# Altium footprint library разъёмы.PcbLib: 129 footprints (part 1 of 9)
Each footprint in its own frame and in the unit in brackets; x right, y up, seen from the top. Pads: shape width x height; smd on the part's side, far side on the other; paste and mask are expansions set on the pad; w line width, h text height; cw(c..) or ccw(c..) is an arc to the next point about the centre after c.
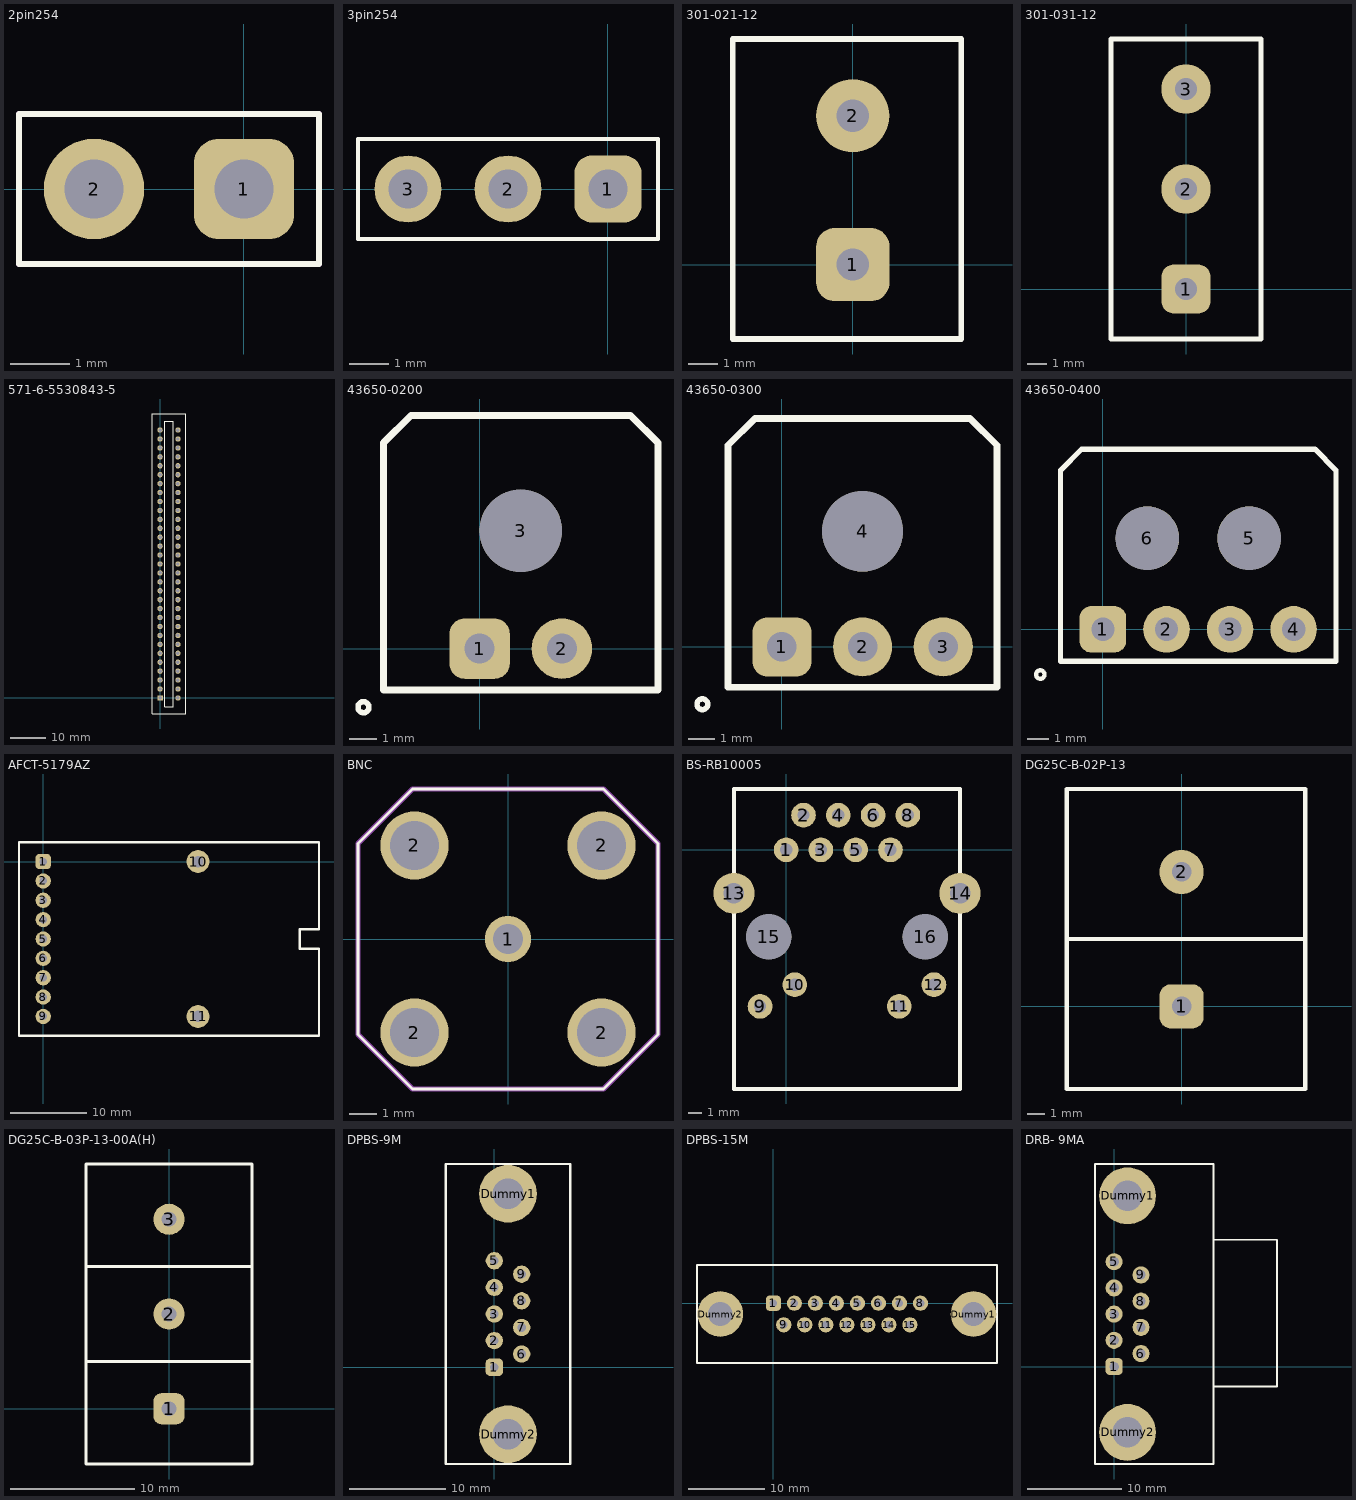
[diagram p0: the footprints below, top view; thin cyan lines are the x and y axes]

## 2pin254 [mm]
pads (2):
  rrect50% 1.7x1.7 hole 1: 1(0,0)
  round 1.7 hole 1: 2(-2.541,0)
Top Overlay:
  lines w0.1: -3.811,-1.27 1.27,-1.27 1.27,1.27 -3.811,1.27 -3.811,-1.27
Mechanical 13:
  lines w0.1: -3.811,-1.27 -3.811,1.27 1.27,1.27 1.27,-1.27 -3.811,-1.27
  text ".Designator" at -3.135,-0.755 h1.5
3D body "Header1x2.STEP": height 8.49, standoff -2.49, extent -3.805,-1.27 1.275,1.27

## 3pin254 [mm]
pads (3):
  rrect50% 1.7x1.7 hole 1: 1(0,0)
  round 1.7 hole 1: 2(-2.541,0) 3(-5.081,0)
Top Overlay:
  lines w0.1: -3.811,-1.27 1.27,-1.27 1.27,1.27 -3.811,1.27 ; -1.27,-1.27 -6.351,-1.27 -6.351,1.27 -1.27,1.27
Mechanical 13:
  lines w0.1: -6.351,-1.27 1.27,-1.27 1.27,1.27 -6.351,1.27 -6.351,-1.27
  text ".Designator" at -0.875,0.75 h1.5
3D body "Header1x2.STEP": height 8.49, standoff -2.49, extent -3.805,-1.27 1.275,1.27
3D body "Header1x2.STEP": height 8.49, standoff -2.49, extent -6.345,-1.27 -1.265,1.27

## 301-021-12 [mm] "XY301VA-5.0-2P-12, Клеммник винтовой, 2-контактный, 5мм, прямой"
height 10
pads (2):
  rrect50% 2.5x2.5 hole 1.1 mask+0.025: 1(0,0)
  round 2.5 hole 1.1 mask+0.025: 2(0,5.08)
Top Overlay:
  lines w0.2: -4.1,-2.54 -4.1,7.7 3.7,7.7 3.7,-2.54 -4.1,-2.54
3D body "User Library-xy301a_5.STEP": height 2.65, standoff -11.75, extent -4,-3.15 3.6,7.55

## 301-031-12 [mm] "XY301VA-5.0-3P-12, Клеммник винтовой, 3-контактный, 5мм, прямой"
height 10
pads (3):
  rrect50% 2.5x2.5 hole 1.1: 1(0,0)
  round 2.5 hole 1.1: 2(0,5.08) 3(0,10.16)
Top Overlay:
  lines w0.254: -3.81,-2.54 -3.81,12.7 3.81,12.7 3.81,-2.54 -3.81,-2.54
3D body "User Library-Terminal-Screw-3A-3way.SLDPRT": height 10, standoff -3, extent -3.81,-2.466 3.79,13.134

## 571-6-5530843-5 [mil]
pads (62):
  rect 60x60 hole 38: A1(0,0)
  round 60 hole 38: A2(0,100) A3(0,200) A4(0,300) A5(0,400) A6(0,500) A7(0,600) A8(0,700) A9(0,800) A10(0,900) A11(0,1000) A12(0,1100) A13(0,1200) A14(0,1300) A15(0,1400) A16(0,1500) A17(0,1600) A18(0,1700) A19(0,1800) A20(0,1900) A21(0,2000) A22(0,2100) A23(0,2200) A24(0,2300) A25(0,2400) A26(0,2500) A27(0,2600) A28(0,2700) A29(0,2800) A30(0,2900) A31(0,3000) B1(200,0) B2(200,100) B3(200,200) B4(200,300) B5(200,400) B6(200,500) B7(200,600) B8(200,700) B9(200,800) B10(200,900) B11(200,1000) B12(200,1100) B13(200,1200) B14(200,1300) B15(200,1400) B16(200,1500) B17(200,1600) B18(200,1700) B19(200,1800) B20(200,1900) B21(200,2000) B22(200,2100) B23(200,2200) B24(200,2300) B25(200,2400) B26(200,2500) B27(200,2600) B28(200,2700) B29(200,2800) B30(200,2900) B31(200,3000)
Top Overlay:
  lines w10: -85,-180 285,-180 285,3180 -85,3180 -85,-180 ; 50,-100 150,-100 150,3100 50,3100 50,-100

## 43650-0200 [mm]
pads (3):
  rrect50% 2.2x2.2 hole 1.1: 1(0,0)
  round 2.2 hole 1.1: 2(3,0)
  round 3 hole 3: 3(1.5,4.3)
Top Overlay:
  circle w0.2: c-4.229,-2.134 r0.2
  lines w0.254: -3.5,-1.5 6.5,-1.5 6.5,7.5 5.5,8.5 -2.5,8.5 -3.5,7.5 -3.5,-1.5

## 43650-0300 [mm]
pads (4):
  rrect50% 2.2x2.2 hole 1.1: 1(0,0)
  round 2.2 hole 1.1: 2(3,0) 3(6,0)
  round 3 hole 3: 4(3,4.3)
Top Overlay:
  circle w0.2: c-2.959,-2.134 r0.2
  lines w0.254: -2,-1.5 -2,7.5 -1,8.5 7,8.5 8,7.5 8,-1.5 -2,-1.5

## 43650-0400 [mm]
pads (6):
  rrect50% 2.2x2.2 hole 1.1: 1(0,0)
  round 2.2 hole 1.1: 2(3,0) 3(6,0) 4(9,0)
  round 3 hole 3: 5(6.9,4.3) 6(2.1,4.3)
Top Overlay:
  circle w0.2: c-2.959,-2.134 r0.2
  lines w0.254: -2,-1.5 11,-1.5 11,7.5 10,8.5 -1,8.5 -2,7.5 -2,-1.5

## AFCT-5179AZ [mm]
pads (11):
  rrect50% 2x2 hole 1: 1(0,0)
  round 2 hole 1: 2(0,-2.54) 3(0,-5.08) 4(0,-7.62) 5(0,-10.16) 6(0,-12.7) 7(0,-15.24) 8(0,-17.78) 9(0,-20.32)
  round 3 hole 1.5: 10(20.32,0) 11(20.32,-20.32)
Top Overlay:
  lines w0.3: -3.175,-22.86 36.195,-22.86 36.195,-11.43 33.655,-11.43 33.655,-8.89 36.195,-8.89 36.195,2.54 -3.175,2.54 -3.175,-22.86

## BNC [mm]
pads (5):
  round 1.7 hole 1.1: 1(0,0)
  round 2.5 hole 1.8: 2(-3.43,-3.43) 2(-3.43,3.43) 2(3.43,-3.43) 2(3.43,3.43)
Top Overlay:
  lines w0.1: -5.5,-3.5 -3.5,-5.5 3.5,-5.5 5.5,-3.5 5.5,3.5 3.5,5.5 -3.5,5.5 -5.5,3.5 -5.5,-3.5
Mechanical 13:
  lines w0.2: -5.5,-3.5 -3.5,-5.5 3.5,-5.5 5.5,-3.5 5.5,3.5 3.5,5.5 -3.5,5.5 -5.5,3.5 -5.5,-3.5
  text ".Designator" at -1.125,-0.725 h1.5
3D body "BNC7T-J-P-HN-ST-TH2D.stp": height 19.86, standoff -3.64, extent -5.535,-5.46 5.535,5.46

## BS-RB10005 [mm]
pads (16):
  round 1.8 hole 0.9: 1(0,0) 2(1.27,2.54) 3(2.54,0) 4(3.81,2.54) 5(5.08,0) 6(6.35,2.54) 7(7.62,0) 8(8.89,2.54) 9(-1.905,-11.43) 10(0.635,-9.842) 11(8.255,-11.43) 12(10.795,-9.842)
  round 3 hole 1.5: 13(-3.81,-3.175) 14(12.7,-3.175)
  round 3.3 hole 3.3: 15(-1.27,-6.35) 16(10.16,-6.35)
Top Overlay:
  lines w0.3: -3.81,-17.462 12.7,-17.462 12.7,4.445 -3.81,4.445 -3.81,-17.462

## DG25C-B-02P-13 [mm]
pads (2):
  rrect50% 2.5x2.5 hole 1.1: 1(0,0)
  round 2.5 hole 1.1: 2(0,7.62)
Top Overlay:
  lines w0.254: -6.5,3.82 7,3.82 ; -6.5,-4.68 7,-4.68 7,12.32 -6.5,12.32 -6.5,-4.68

## DG25C-B-03P-13-00A(H) [mm]
pads (3):
  rrect50% 2.5x2.5 hole 1.2: 1(0,0)
  round 2.5 hole 1.2: 2(0,7.62) 3(0,15.24)
Top Overlay:
  lines w0.254: -6.667,3.81 6.667,3.81 ; -6.667,11.43 6.667,11.43 ; -6.667,-4.445 6.667,-4.445 6.667,19.685 -6.667,19.685 -6.667,-4.445

## DPBS-9M [mm]
pads (11):
  rrect50% 1.8x1.8 hole 0.9: 1(0,0)
  round 1.8 hole 0.9: 2(0,2.769) 3(0,5.537) 4(0,8.306) 5(0,11.074) 6(2.845,1.372) 7(2.845,4.14) 8(2.845,6.909) 9(2.845,9.677)
  round 6 hole 3.2: Dummy1(1.422,18.034) Dummy2(1.422,-6.96)
Top Overlay:
  lines w0.254: -5.055,-10.058 7.899,-10.058 7.899,21.133 -5.055,21.133 -5.055,-10.058

## DPBS-15M [mm]
pads (17):
  rrect50% 2x2 hole 1: 1(0,0)
  round 2 hole 1: 2(2.769,0) 3(5.537,0) 4(8.306,0) 5(11.074,0) 6(13.843,0) 7(16.612,0) 8(19.38,0) 9(1.372,-2.845) 10(4.14,-2.845) 11(6.909,-2.845) 12(9.677,-2.845) 13(12.446,-2.845) 14(15.215,-2.845) 15(17.983,-2.845)
  round 6 hole 3.2: Dummy1(26.365,-1.422) Dummy2(-6.985,-1.422)
Top Overlay:
  lines w0.254: -10.058,-7.899 -10.058,5.055 29.464,5.055 29.464,-7.899 -10.058,-7.899

## DRB- 9MA [mm]
pads (11):
  rrect50% 1.8x1.8 hole 1: 1(0,0)
  round 1.8 hole 1: 2(0,2.769) 3(0,5.537) 4(0,8.306) 5(0,11.074) 6(2.845,1.372) 7(2.845,4.14) 8(2.845,6.909) 9(2.845,9.677)
  round 6 hole 3.2: Dummy1(1.422,18.034) Dummy2(1.422,-6.96)
Top Overlay:
  lines w0.2: 10.5,-2.1 17.2,-2.1 17.2,13.4 10.5,13.4 ; -2,-10.3 10.499,-10.3 10.499,21.4 -2,21.4 -2,-10.3
3D body "User Library-43767.X_B": height 12.65, standoff -3.85, extent -1.625,-9.9 16.875,20.9